# Altium footprint library IC.PcbLib: 386 footprints (part 1 of 30)
Each footprint in its own frame and in the unit in brackets; x right, y up, seen from the top. Pads: shape width x height; smd on the part's side, far side on the other; paste and mask are expansions set on the pad; w line width, h text height; cw(c..) or ccw(c..) is an arc to the next point about the centre after c.
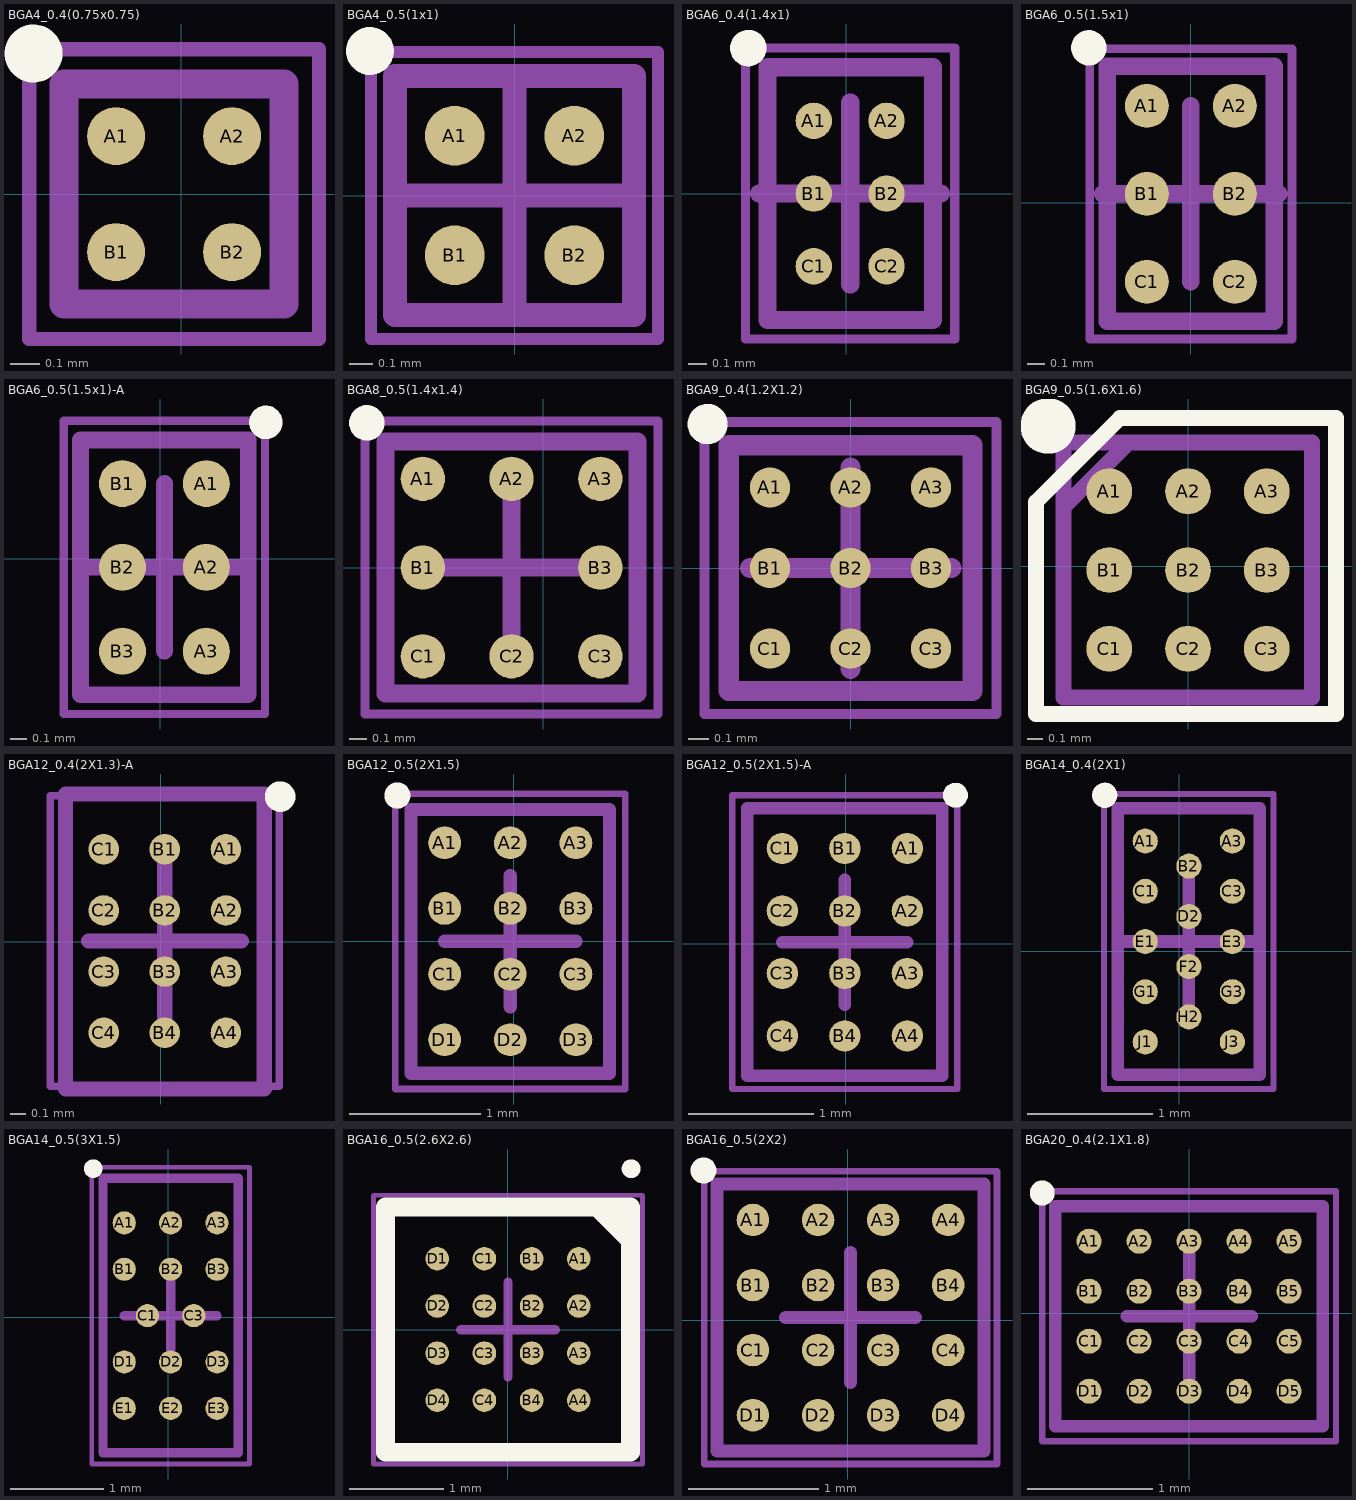
[diagram p0: the footprints below, top view; thin cyan lines are the x and y axes]

## BGA4_0.4(0.75x0.75) [mm]
pads (4):
  round 0.2 smd: A1(-0.225,0.2) A2(0.175,0.2) B1(-0.225,-0.2) B2(0.175,-0.2)
Top Overlay:
  circle w0.1: c-0.51,0.485 r0.05
Mechanical 13:
  lines w0.1: -0.405,-0.38 -0.405,0.38 0.355,0.38 0.355,-0.38 -0.405,-0.38
Mechanical 15:
  lines w0.05: -0.525,-0.5 -0.525,0.5 0.475,0.5 0.475,-0.5 -0.525,-0.5
3D body "BGA4C40P2X2_86X86X60.step": height 0.6, standoff 0, extent -0.455,-0.43 0.405,0.43

## BGA4_0.5(1x1) [mm]
pads (4):
  round 0.25 smd: A1(-0.25,0.25) A2(0.25,0.25) B1(-0.25,-0.25) B2(0.25,-0.25)
Top Overlay:
  circle w0.1: c-0.605,0.605 r0.05
Mechanical 13:
  lines w0.1: -0.5,-0.5 0.5,-0.5 0.5,0.5 -0.5,0.5 -0.5,-0.5
Mechanical 15:
  lines w0.05: -0.6,-0.6 0.6,-0.6 0.6,0.6 -0.6,0.6 -0.6,-0.6
  lines w0.1: -0.5,0 0.5,0 ; 0,-0.5 0,0.5
3D body "BGA4C50P2X2_100X100X60.step": height 0.6, standoff 0, extent -0.5,-0.5 0.5,0.5

## BGA6_0.4(1.4x1) [mm]
pads (6):
  round 0.2 smd: A1(-0.178,0.4) A2(0.222,0.4) B1(-0.178,0) B2(0.222,0) C1(-0.178,-0.4) C2(0.222,-0.4)
Top Overlay:
  circle w0.1: c-0.538,0.8 r0.05
Mechanical 13:
  lines w0.1: -0.433,-0.695 -0.433,0.695 0.477,0.695 0.477,-0.695 -0.433,-0.695
Mechanical 15:
  lines w0.05: -0.553,-0.8 -0.553,0.8 0.597,0.8 0.597,-0.8 -0.553,-0.8
  lines w0.1: -0.478,0 0.522,0 ; 0.022,-0.5 0.022,0.5
3D body "BGA6C40P2X3_100X140X65.step": height 0.65, standoff 0, extent -0.475,-0.674 0.525,0.726

## BGA6_0.5(1.5x1) [mm]
pads (6):
  round 0.25 smd: A1(-0.25,0.551) A2(0.25,0.551) B1(-0.25,0.051) B2(0.25,0.051) C1(-0.25,-0.449) C2(0.25,-0.449)
Top Overlay:
  circle w0.1: c-0.58,0.881 r0.05
Mechanical 13:
  lines w0.1: -0.475,-0.674 -0.475,0.776 0.475,0.776 0.475,-0.674 -0.475,-0.674
Mechanical 15:
  lines w0.05: -0.575,-0.774 -0.575,0.876 0.575,0.876 0.575,-0.774 -0.575,-0.774
  lines w0.1: -0.5,0.051 0.5,0.051 ; 0,-0.449 0,0.551
3D body "User Library-XBGA6_500.step": height 0.63, standoff 0, extent -0.525,-0.72 0.475,0.77

## BGA6_0.5(1.5x1)-A [mm]
pads (6):
  round 0.28 smd: A1(0.275,0.449) A2(0.275,-0.051) A3(0.275,-0.551) B1(-0.225,0.449) B2(-0.225,-0.051) B3(-0.225,-0.551)
Top Overlay:
  circle w0.1: c0.63,0.814 r0.05
Mechanical 13:
  lines w0.1: -0.475,-0.811 0.525,-0.811 0.525,0.709 -0.475,0.709 -0.475,-0.811
Mechanical 15:
  lines w0.05: -0.575,-0.926 0.625,-0.926 0.625,0.824 -0.575,0.824 -0.575,-0.926
  lines w0.1: -0.475,-0.051 0.525,-0.051 ; 0.025,-0.551 0.025,0.449
3D body "User Library-XBGA6_500.step": height 0.63, standoff 0, extent -0.5,-0.796 0.5,0.694

## BGA8_0.5(1.4x1.4) [mm]
pads (8):
  round 0.25 smd: A1(-0.678,0.5) A2(-0.178,0.5) A3(0.322,0.5) B1(-0.678,0) B3(0.322,0) C1(-0.678,-0.5) C2(-0.178,-0.5) C3(0.322,-0.5)
Top Overlay:
  circle w0.1: c-0.993,0.815 r0.05
Mechanical 13:
  lines w0.1: -0.888,-0.71 -0.888,0.71 0.532,0.71 0.532,-0.71 -0.888,-0.71
Mechanical 15:
  lines w0.05: -1.003,-0.825 -1.003,0.825 0.647,0.825 0.647,-0.825 -1.003,-0.825
  lines w0.1: -0.678,0 0.322,0 ; -0.178,-0.5 -0.178,0.5
3D body "User Library-DSBGA-8.step": height 0.51, standoff 0, extent -0.884,-0.728 0.58,0.71

## BGA9_0.4(1.2X1.2) [mm]
pads (9):
  round 0.2 smd: A1(-0.4,0.4) A2(0,0.4) A3(0.4,0.4) B1(-0.4,0) B2(0,0) B3(0.4,0) C1(-0.4,-0.4) C2(0,-0.4) C3(0.4,-0.4)
Top Overlay:
  circle w0.1: c-0.71,0.715 r0.05
Mechanical 13:
  lines w0.1: -0.605,-0.61 0.605,-0.61 0.605,0.61 -0.605,0.61 -0.605,-0.61
Mechanical 15:
  lines w0.05: -0.725,-0.725 0.725,-0.725 0.725,0.725 -0.725,0.725 -0.725,-0.725
  lines w0.1: -0.5,0 0.5,0 ; 0,-0.5 0,0.5
3D body "User Library-YFF_(BGA9).STEP": height 0.63, standoff 0.01, extent -0.6,-0.65 0.6,0.65

## BGA9_0.5(1.6X1.6) [mm]
pads (9):
  round 0.29 smd: A1(-0.5,0.475) A2(0,0.475) A3(0.5,0.475) B1(-0.5,-0.025) B2(0,-0.025) B3(0.5,-0.025) C1(-0.5,-0.525) C2(0,-0.525) C3(0.5,-0.525)
Top Overlay:
  circle w0.2: c-0.889,0.889 r0.076
  lines w0.1: -0.965,-0.94 0.94,-0.94 0.94,0.94 -0.432,0.94 -0.965,0.406 -0.965,-0.94
Mechanical 13:
  lines w0.1: -0.79,0.373 -0.377,0.786 ; -0.79,-0.835 0.787,-0.835 0.787,0.785 -0.79,0.785 -0.79,-0.835
3D body "BQ27220YZFR.stp": height 0.63, standoff 0, extent -0.79,-0.836 0.79,0.785

## BGA12_0.4(2X1.3)-A [mm]
pads (12):
  round 0.2 smd: A1(0.425,0.603) A2(0.425,0.203) A3(0.425,-0.197) A4(0.425,-0.597) B1(0.025,0.603) B2(0.025,0.203) B3(0.025,-0.197) B4(0.025,-0.597) C1(-0.375,0.603) C2(-0.375,0.203) C3(-0.375,-0.197) C4(-0.375,-0.597)
Top Overlay:
  circle w0.1: c0.78,0.948 r0.05
Mechanical 13:
  lines w0.1: -0.625,-0.965 0.675,-0.965 0.675,0.965 -0.625,0.965 -0.625,-0.965
Mechanical 15:
  lines w0.05: -0.725,-0.947 0.775,-0.947 0.775,0.953 -0.725,0.953 -0.725,-0.947
  lines w0.1: -0.475,0.003 0.525,0.003 ; 0.025,-0.497 0.025,0.503
3D body "User Library-BGA12NP40_3X4_129X199X62B25.step": height 0.63, standoff 0, extent -0.594,-0.995 0.696,0.995

## BGA12_0.5(2X1.5) [mm]
pads (12):
  round 0.25 smd: A1(-0.525,0.75) A2(-0.025,0.75) A3(0.475,0.75) B1(-0.525,0.25) B2(-0.025,0.25) B3(0.475,0.25) C1(-0.525,-0.25) C2(-0.025,-0.25) C3(0.475,-0.25) D1(-0.525,-0.75) D2(-0.025,-0.75) D3(0.475,-0.75)
Top Overlay:
  circle w0.1: c-0.885,1.11 r0.05
Mechanical 13:
  lines w0.1: -0.78,-1.005 -0.78,1.005 0.73,1.005 0.73,-1.005 -0.78,-1.005
Mechanical 15:
  lines w0.05: -0.9,-1.125 -0.9,1.125 0.85,1.125 0.85,-1.125 -0.9,-1.125
  lines w0.1: -0.525,0 0.475,0 ; -0.025,-0.5 -0.025,0.5
3D body "User Library-BGA12C50P3X4_156X206X62.STEP": height 0.63, standoff 0.01, extent -0.805,-1.004 0.755,1.056

## BGA12_0.5(2X1.5)-A [mm]
pads (12):
  round 0.25 smd: A1(0.492,0.762) A2(0.492,0.262) A3(0.492,-0.238) A4(0.492,-0.738) B1(-0.008,0.762) B2(-0.008,0.262) B3(-0.008,-0.238) B4(-0.008,-0.738) C1(-0.508,0.762) C2(-0.508,0.262) C3(-0.508,-0.238) C4(-0.508,-0.738)
Top Overlay:
  circle w0.1: c0.877,1.187 r0.05
Mechanical 13:
  lines w0.1: -0.788,-1.058 -0.788,1.082 0.772,1.082 0.772,-1.058 -0.788,-1.058
Mechanical 15:
  lines w0.05: -0.908,-1.163 -0.908,1.187 0.892,1.187 0.892,-1.163 -0.908,-1.163
  lines w0.1: -0.508,0.012 0.492,0.012 ; -0.008,-0.488 -0.008,0.512
3D body "MAX11801EWC+T.stp": height 0.69, standoff 0, extent -0.777,-1.042 0.778,1.093

## BGA14_0.4(2X1) [mm]
pads (14):
  round 0.2 smd: A1(-0.271,0.879) A3(0.423,0.879) B2(0.076,0.679) C1(-0.271,0.479) C3(0.423,0.479) D2(0.076,0.279) E1(-0.271,0.079) E3(0.423,0.079) F2(0.076,-0.121) G1(-0.271,-0.321) G3(0.423,-0.321) H2(0.076,-0.521) J1(-0.271,-0.721) J3(0.423,-0.721)
Top Overlay:
  circle w0.1: c-0.594,1.244 r0.05
Mechanical 13:
  lines w0.1: -0.489,-0.981 0.641,-0.981 0.641,1.139 -0.489,1.139 -0.489,-0.981
Mechanical 15:
  lines w0.05: -0.599,-1.096 0.751,-1.096 0.751,1.254 -0.599,1.254 -0.599,-1.096
  lines w0.1: -0.424,0.079 0.576,0.079 ; 0.076,-0.421 0.076,0.579
3D body: height 0.66, standoff 0.2, extent -0.378,0.815 -0.179,1.014
3D body: height 0.65, standoff 0.17, extent -0.489,-0.981 0.641,1.139

## BGA14_0.5(3X1.5) [mm]
pads (14):
  round 0.25 smd: A1(-0.475,1.017) A2(0.025,1.017) A3(0.525,1.017) B1(-0.475,0.517) B2(0.025,0.517) B3(0.525,0.517) C1(-0.225,0.017) C3(0.275,0.017) D1(-0.475,-0.483) D2(0.025,-0.483) D3(0.525,-0.483) E1(-0.475,-0.983) E2(0.025,-0.983) E3(0.525,-0.983)
Top Overlay:
  circle w0.1: c-0.81,1.602 r0.05
Mechanical 13:
  lines w0.1: -0.705,-1.463 -0.705,1.497 0.755,1.497 0.755,-1.463 -0.705,-1.463
Mechanical 15:
  lines w0.05: -0.825,-1.583 -0.825,1.617 0.875,1.617 0.875,-1.583 -0.825,-1.583
  lines w0.1: -0.475,0.017 0.525,0.017 ; 0.025,-0.483 0.025,0.517
3D body: height 0.66, standoff 0.2, extent -0.582,1.17 -0.383,1.37
3D body: height 0.65, standoff 0.21, extent -0.705,-1.463 0.755,1.497

## BGA16_0.5(2.6X2.6) [mm]
pads (16):
  round 0.25 smd: A1(0.75,0.75) A2(0.75,0.25) A3(0.75,-0.25) A4(0.75,-0.75) B1(0.25,0.75) B2(0.25,0.25) B3(0.25,-0.25) B4(0.25,-0.75) C1(-0.25,0.75) C2(-0.25,0.25) C3(-0.25,-0.25) C4(-0.25,-0.75) D1(-0.75,0.75) D2(-0.75,0.25) D3(-0.75,-0.25) D4(-0.75,-0.75)
Top Overlay:
  circle w0.1: c1.305,1.705 r0.05
  region: 1.3,0.942 0.942,1.3 1.3,1.3
  lines w0.2: 0.942,1.3 1.3,0.942 ; -1.3,-1.3 -1.3,1.3 1.3,1.3 1.3,-1.3 -1.3,-1.3
Mechanical 13:
  lines w0.1: -1.305,-1.305 -1.305,1.305 1.305,1.305 1.305,-1.305 -1.305,-1.305
Mechanical 15:
  lines w0.05: -1.425,-1.425 -1.425,1.425 1.425,1.425 1.425,-1.425 -1.425,-1.425
  lines w0.1: -0.5,0 0.5,0 ; 0,-0.5 0,0.5
3D body "BGA16C50P4X4_260X260X65.step": height 0.65, standoff 0, extent -1.275,-1.275 1.325,1.325

## BGA16_0.5(2X2) [mm]
pads (16):
  round 0.25 smd: A1(-0.729,0.771) A2(-0.229,0.771) A3(0.271,0.771) A4(0.771,0.771) B1(-0.729,0.271) B2(-0.229,0.271) B3(0.271,0.271) B4(0.771,0.271) C1(-0.729,-0.229) C2(-0.229,-0.229) C3(0.271,-0.229) C4(0.771,-0.229) D1(-0.729,-0.729) D2(-0.229,-0.729) D3(0.271,-0.729) D4(0.771,-0.729)
Top Overlay:
  circle w0.1: c-1.109,1.151 r0.05
Mechanical 13:
  lines w0.1: -1.004,-1.004 1.046,-1.004 1.046,1.046 -1.004,1.046 -1.004,-1.004
Mechanical 15:
  lines w0.05: -1.104,-1.104 1.146,-1.104 1.146,1.146 -1.104,1.146 -1.104,-1.104
  lines w0.1: -0.479,0.021 0.521,0.021 ; 0.021,-0.479 0.021,0.521
3D body "BGA16C50P4X4_200X200X65.step": height 0.65, standoff 0, extent -1,-1 1,1

## BGA20_0.4(2.1X1.8) [mm]
height 0.254
pads (20):
  round 0.2 smd: A1(-0.8,0.575) A2(-0.4,0.575) A3(0,0.575) A4(0.4,0.575) A5(0.8,0.575) B1(-0.8,0.175) B2(-0.4,0.175) B3(0,0.175) B4(0.4,0.175) B5(0.8,0.175) C1(-0.8,-0.225) C2(-0.4,-0.225) C3(0,-0.225) C4(0.4,-0.225) C5(0.8,-0.225) D1(-0.8,-0.625) D2(-0.4,-0.625) D3(0,-0.625) D4(0.4,-0.625) D5(0.8,-0.625)
Top Overlay:
  circle w0.1: c-1.175,0.96 r0.05
Mechanical 13:
  lines w0.1: -1.07,-0.905 -1.07,0.855 1.07,0.855 1.07,-0.905 -1.07,-0.905
Mechanical 15:
  lines w0.05: -1.175,-1.025 -1.175,0.975 1.175,0.975 1.175,-1.025 -1.175,-1.025
  lines w0.1: -0.5,-0.025 0.5,-0.025 ; 0,-0.525 0,0.475
3D body "BGA16C40P5X4_210X180X65.step": height 0.65, standoff 0, extent -1.05,-0.976 1.05,0.824